# Altium footprint library Contact.PcbLib: 85 footprints (part 1 of 6)
Each footprint in its own frame and in the unit in brackets; x right, y up, seen from the top. Pads: shape width x height; smd on the part's side, far side on the other; paste and mask are expansions set on the pad; w line width, h text height; cw(c..) or ccw(c..) is an arc to the next point about the centre after c.
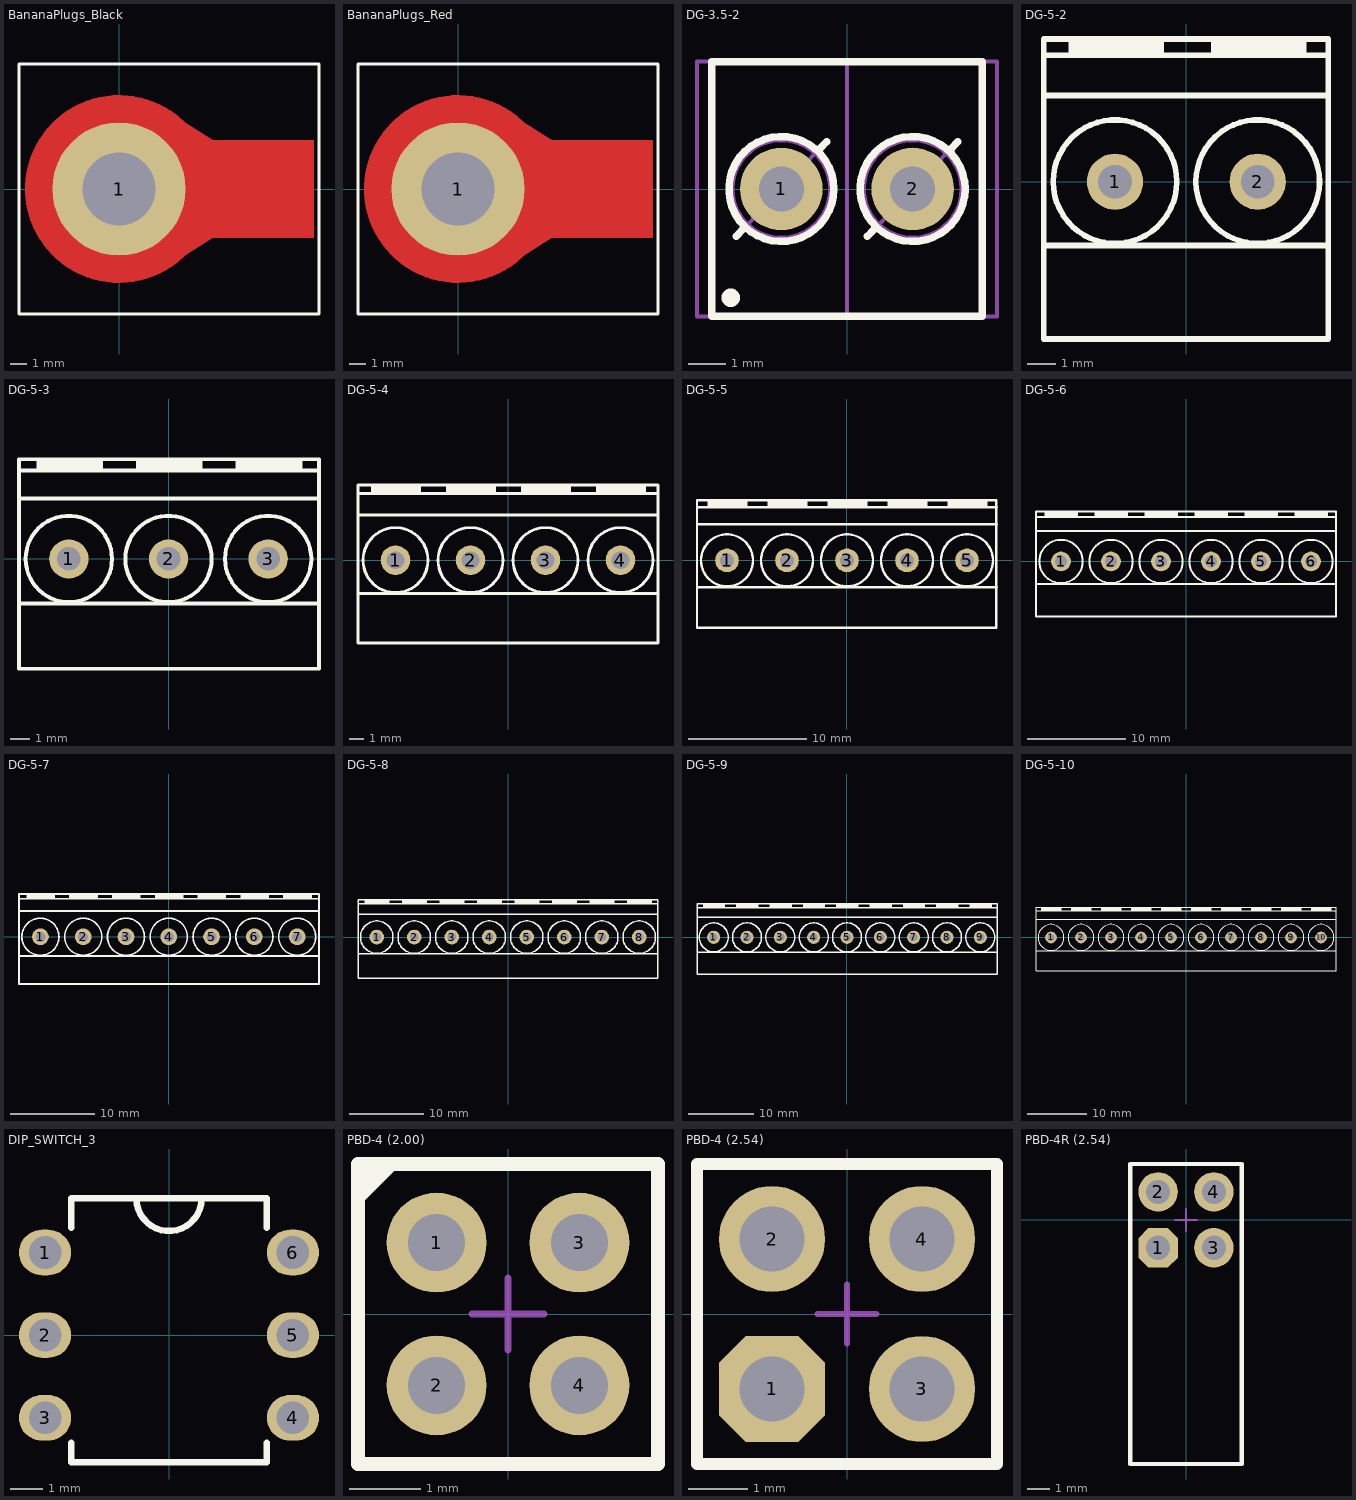
[diagram p0: the footprints below, top view; thin cyan lines are the x and y axes]

## BananaPlugs_Black [mm]
pads (1):
  round 8 hole 4.4: 1(0,0)
Top Layer:
  region: 2.936,-4.634 2.627,-4.831 1.961,-5.137 1.26,-5.352 0.537,-5.472 -0.196,-5.495 -0.926,-5.42 -1.639,-5.249 -2.322,-4.984 -2.965,-4.631 -3.554,-4.195 -4.081,-3.685 -4.535,-3.109 -4.908,-2.478 -5.195,-1.803 -5.388,-1.096 -5.486,-0.37 -5.487,0.363 -5.39,1.09 -5.197,1.797 -4.911,2.473 -4.539,3.104 -4.085,3.68 -3.559,4.191 -2.97,4.628 -2.328,4.982 -1.644,5.247 -0.932,5.419 -0.203,5.495 0.53,5.473 1.254,5.354 1.955,5.139 2.621,4.834 2.931,4.638 10.26,0.006
  region: 0,0 11.684,0 11.684,2.921 0,2.921
  region: 0,-2.921 11.684,-2.921 11.684,0 0,0
  lines w0.305: 4.03,-3.723 cw(c0,0) 4.03,3.723 ; 4.039,-3.708 7.747,0 4.039,3.708
Bottom Layer:
  region: 4.03,-3.723 3.781,-3.992 3.218,-4.458 2.598,-4.846 1.932,-5.148 1.232,-5.359 0.51,-5.475 -0.221,-5.494 -0.948,-5.416 -1.659,-5.242 -2.34,-4.976 -2.979,-4.622 -3.566,-4.185 -4.09,-3.675 -4.542,-3.1 -4.913,-2.47 -5.197,-1.796 -5.389,-1.09 -5.486,-0.366 -5.486,0.366 -5.389,1.09 -5.197,1.796 -4.913,2.47 -4.542,3.1 -4.09,3.675 -3.566,4.185 -2.979,4.622 -2.34,4.976 -1.659,5.242 -0.948,5.416 -0.221,5.494 0.51,5.475 1.232,5.359 1.932,5.148 2.598,4.846 3.218,4.458 3.781,3.992 4.03,3.723 4.039,3.708 7.747,0
  region: 2.936,-4.634 2.627,-4.831 1.961,-5.137 1.26,-5.352 0.537,-5.472 -0.196,-5.495 -0.926,-5.42 -1.639,-5.249 -2.322,-4.984 -2.965,-4.631 -3.554,-4.195 -4.081,-3.685 -4.535,-3.109 -4.908,-2.478 -5.195,-1.803 -5.388,-1.096 -5.486,-0.37 -5.487,0.363 -5.39,1.09 -5.197,1.797 -4.911,2.473 -4.539,3.104 -4.085,3.68 -3.559,4.191 -2.97,4.628 -2.328,4.982 -1.644,5.247 -0.932,5.419 -0.203,5.495 0.53,5.473 1.254,5.354 1.955,5.139 2.621,4.834 2.931,4.638 10.26,0.006
  region: 0,-2.921 11.684,-2.921 11.684,0 0,0
  region: 0,0 11.684,0 11.684,2.921 0,2.921
Top Overlay:
  lines w0.2: -6,-7.5 0,-7.5 3,-7.5 12,-7.5 12,7.5 -6,7.5 -6,-7.5
Top Solder:
  region: 4.03,-3.723 3.781,-3.992 3.218,-4.458 2.598,-4.846 1.932,-5.148 1.232,-5.359 0.51,-5.475 -0.221,-5.494 -0.948,-5.416 -1.659,-5.242 -2.34,-4.976 -2.979,-4.622 -3.566,-4.185 -4.09,-3.675 -4.542,-3.1 -4.913,-2.47 -5.197,-1.796 -5.389,-1.09 -5.486,-0.366 -5.486,0.366 -5.389,1.09 -5.197,1.796 -4.913,2.47 -4.542,3.1 -4.09,3.675 -3.566,4.185 -2.979,4.622 -2.34,4.976 -1.659,5.242 -0.948,5.416 -0.221,5.494 0.51,5.475 1.232,5.359 1.932,5.148 2.598,4.846 3.218,4.458 3.781,3.992 4.03,3.723 4.039,3.708 7.747,0
  region: 0,0 11.684,0 11.684,2.921 0,2.921
  region: 0,-2.921 11.684,-2.921 11.684,0 0,0
Bottom Solder:
  region: 4.03,-3.723 3.781,-3.992 3.218,-4.458 2.598,-4.846 1.932,-5.148 1.232,-5.359 0.51,-5.475 -0.221,-5.494 -0.948,-5.416 -1.659,-5.242 -2.34,-4.976 -2.979,-4.622 -3.566,-4.185 -4.09,-3.675 -4.542,-3.1 -4.913,-2.47 -5.197,-1.796 -5.389,-1.09 -5.486,-0.366 -5.486,0.366 -5.389,1.09 -5.197,1.796 -4.913,2.47 -4.542,3.1 -4.09,3.675 -3.566,4.185 -2.979,4.622 -2.34,4.976 -1.659,5.242 -0.948,5.416 -0.221,5.494 0.51,5.475 1.232,5.359 1.932,5.148 2.598,4.846 3.218,4.458 3.781,3.992 4.03,3.723 4.039,3.708 7.747,0
  region: 0,-2.921 11.684,-2.921 11.684,0 0,0
  region: 0,0 11.684,0 11.684,2.921 0,2.921
3D body "User Library-ST-351B V1 - BLACK.STEP": height 8.3, standoff -7.7, extent -5.65,-5.644 11.6,5.644

## BananaPlugs_Red [mm]
pads (1):
  round 8 hole 4.4: 1(0,0)
Top Layer:
  region: 0,-2.921 11.684,-2.921 11.684,0 0,0
  region: 0,0 11.684,0 11.684,2.921 0,2.921
  region: 2.936,-4.634 2.627,-4.831 1.961,-5.137 1.26,-5.352 0.537,-5.472 -0.196,-5.495 -0.926,-5.42 -1.639,-5.249 -2.322,-4.984 -2.965,-4.631 -3.554,-4.195 -4.081,-3.685 -4.535,-3.109 -4.908,-2.478 -5.195,-1.803 -5.388,-1.096 -5.486,-0.37 -5.487,0.363 -5.39,1.09 -5.197,1.797 -4.911,2.473 -4.539,3.104 -4.085,3.68 -3.559,4.191 -2.97,4.628 -2.328,4.982 -1.644,5.247 -0.932,5.419 -0.203,5.495 0.53,5.473 1.254,5.354 1.955,5.139 2.621,4.834 2.931,4.638 10.26,0.006
  lines w0.305: 4.03,-3.723 cw(c0,0) 4.03,3.723 ; 4.039,-3.708 7.747,0 4.039,3.708
Bottom Layer:
  region: 0,0 11.684,0 11.684,2.921 0,2.921
  region: 0,-2.921 11.684,-2.921 11.684,0 0,0
  region: 2.936,-4.634 2.627,-4.831 1.961,-5.137 1.26,-5.352 0.537,-5.472 -0.196,-5.495 -0.926,-5.42 -1.639,-5.249 -2.322,-4.984 -2.965,-4.631 -3.554,-4.195 -4.081,-3.685 -4.535,-3.109 -4.908,-2.478 -5.195,-1.803 -5.388,-1.096 -5.486,-0.37 -5.487,0.363 -5.39,1.09 -5.197,1.797 -4.911,2.473 -4.539,3.104 -4.085,3.68 -3.559,4.191 -2.97,4.628 -2.328,4.982 -1.644,5.247 -0.932,5.419 -0.203,5.495 0.53,5.473 1.254,5.354 1.955,5.139 2.621,4.834 2.931,4.638 10.26,0.006
  region: 4.03,-3.723 3.781,-3.992 3.218,-4.458 2.598,-4.846 1.932,-5.148 1.232,-5.359 0.51,-5.475 -0.221,-5.494 -0.948,-5.416 -1.659,-5.242 -2.34,-4.976 -2.979,-4.622 -3.566,-4.185 -4.09,-3.675 -4.542,-3.1 -4.913,-2.47 -5.197,-1.796 -5.389,-1.09 -5.486,-0.366 -5.486,0.366 -5.389,1.09 -5.197,1.796 -4.913,2.47 -4.542,3.1 -4.09,3.675 -3.566,4.185 -2.979,4.622 -2.34,4.976 -1.659,5.242 -0.948,5.416 -0.221,5.494 0.51,5.475 1.232,5.359 1.932,5.148 2.598,4.846 3.218,4.458 3.781,3.992 4.03,3.723 4.039,3.708 7.747,0
Top Overlay:
  lines w0.2: -6,-7.5 -6,7.5 12,7.5 12,-7.5 3,-7.5 0,-7.5 -6,-7.5
Top Solder:
  region: 0,-2.921 11.684,-2.921 11.684,0 0,0
  region: 0,0 11.684,0 11.684,2.921 0,2.921
  region: 4.03,-3.723 3.781,-3.992 3.218,-4.458 2.598,-4.846 1.932,-5.148 1.232,-5.359 0.51,-5.475 -0.221,-5.494 -0.948,-5.416 -1.659,-5.242 -2.34,-4.976 -2.979,-4.622 -3.566,-4.185 -4.09,-3.675 -4.542,-3.1 -4.913,-2.47 -5.197,-1.796 -5.389,-1.09 -5.486,-0.366 -5.486,0.366 -5.389,1.09 -5.197,1.796 -4.913,2.47 -4.542,3.1 -4.09,3.675 -3.566,4.185 -2.979,4.622 -2.34,4.976 -1.659,5.242 -0.948,5.416 -0.221,5.494 0.51,5.475 1.232,5.359 1.932,5.148 2.598,4.846 3.218,4.458 3.781,3.992 4.03,3.723 4.039,3.708 7.747,0
Bottom Solder:
  region: 0,0 11.684,0 11.684,2.921 0,2.921
  region: 0,-2.921 11.684,-2.921 11.684,0 0,0
  region: 4.03,-3.723 3.781,-3.992 3.218,-4.458 2.598,-4.846 1.932,-5.148 1.232,-5.359 0.51,-5.475 -0.221,-5.494 -0.948,-5.416 -1.659,-5.242 -2.34,-4.976 -2.979,-4.622 -3.566,-4.185 -4.09,-3.675 -4.542,-3.1 -4.913,-2.47 -5.197,-1.796 -5.389,-1.09 -5.486,-0.366 -5.486,0.366 -5.389,1.09 -5.197,1.796 -4.913,2.47 -4.542,3.1 -4.09,3.675 -3.566,4.185 -2.979,4.622 -2.34,4.976 -1.659,5.242 -0.948,5.416 -0.221,5.494 0.51,5.475 1.232,5.359 1.932,5.148 2.598,4.846 3.218,4.458 3.781,3.992 4.03,3.723 4.039,3.708 7.747,0
3D body "User Library-ST-351A V1 - RED.STEP": height 8.3, standoff -7.7, extent -5.65,-5.644 11.6,5.643

## DG-3.5-2 [mm]
pads (3):
  round 2.2 hole 1.2: 1(-1.75,0) 2(1.75,0)
  round 0.5 on Top Overlay: ""(-3.1,-2.9)
Top Overlay:
  circle w0.2: c1.75,0 r1.4
  circle w0.2: c-1.75,0 r1.4
  lines w0.2: -2.959,-1.266 -2.776,-1.074 ; -0.724,1.074 -0.541,1.267 ; 0.541,-1.266 0.724,-1.074 ; 2.776,1.074 2.959,1.267 ; -3.6,-3.4 3.6,-3.4 3.6,3.4 -3.6,3.4 -3.6,-3.4
Mechanical 1:
  circle w0.1: c-1.75,0 r1.3
  circle w0.1: c1.75,0 r1.3
  lines w0.1: -2.632,-0.931 -0.868,0.931 ; 0,-3.4 0,3.4 ; 0.868,-0.931 2.632,0.931 ; -4,-3.4 -4,3.4 4,3.4 4,-3.4 -4,-3.4
Mechanical 15:
  lines w0.1: -4,-3.4 -4,3.4 4,3.4 4,-3.4 -4,-3.4
3D body "User Library-DG350-3,5-02P.STEP": height 8.4, standoff -3.4, extent -4,-3.4 4,3.4

## DG-5-2 [mm] "Terminal Block Green"
pads (2):
  round 2 / inner round 2 / far side oval 2.4x3 hole 1.2: 1(-2.54,0) 2(2.54,0)
Top Overlay:
  circle w0.2: c-2.54,0 r2.2
  circle w0.2: c2.54,0 r2.2
  rectangle: -4.2,4.5 -0.8,5.08
  rectangle: 0.88,4.5 4.28,5.08
  lines w0.2: -5.08,-2.27 5.055,-2.27 ; -5.08,3.07 5.055,3.07 ; -5.08,4.5 5.055,4.5 ; -5.08,-5.6 5.055,-5.6 5.055,5.08 -5.08,5.08 -5.08,-5.6
3D body "User Library-klema-5mm-2pin.step": height 14, standoff -4, extent -5,-5.5 5,5

## DG-5-3 [mm] "Terminal Block Green"
pads (3):
  round 2 / inner round 2 / far side oval 2.4x3 hole 1.2: 1(-5.08,0) 2(0,0) 3(5.08,0)
Top Overlay:
  circle w0.2: c5.08,0 r2.2
  circle w0.2: c0,0 r2.2
  circle w0.2: c-5.08,0 r2.2
  rectangle: -6.74,4.5 -3.34,5.08
  rectangle: -1.66,4.5 1.74,5.08
  rectangle: 3.42,4.5 6.82,5.08
  lines w0.2: -7.62,-2.27 7.6,-2.27 ; -7.62,3.07 7.6,3.07 ; -7.62,4.5 7.6,4.5 ; -7.62,-5.6 7.671,-5.6 7.671,5.08 -7.62,5.08 -7.62,-5.6
3D body "User Library-klema-5mm-3pin.step": height 14.1, standoff -3.9, extent -7.5,-5.5 7.5,5

## DG-5-4 [mm] "Terminal Block Green"
pads (4):
  round 2 / inner round 2 / far side oval 2.4x3 hole 1.2: 1(-7.62,0) 2(-2.54,0) 3(2.54,0) 4(7.62,0)
Top Overlay:
  circle w0.2: c7.62,0 r2.2
  circle w0.2: c2.54,0 r2.2
  circle w0.2: c-2.54,0 r2.2
  circle w0.2: c-7.62,0 r2.2
  rectangle: 5.96,4.5 9.36,5.08
  rectangle: 0.88,4.5 4.28,5.08
  rectangle: -4.2,4.5 -0.8,5.08
  rectangle: -9.28,4.5 -5.88,5.08
  lines w0.2: -10.16,-2.27 10.16,-2.27 ; -10.16,3.07 10.16,3.07 ; -10.16,4.5 10.16,4.5 ; -10.16,-5.6 10.16,-5.6 10.16,5.08 -10.16,5.08 -10.16,-5.6
3D body "User Library-klema-5mm-2pin.step": height 14, standoff -4, extent 0.08,-5.5 10.08,5
3D body "User Library-klema-5mm-2pin.step": height 14, standoff -4, extent -10.08,-5.5 -0.08,5

## DG-5-5 [mm] "Terminal Block Green"
pads (5):
  round 2 / inner round 2 / far side oval 2.4x3 hole 1.2: 1(-10.16,0) 2(-5.08,0) 3(0,0) 4(5.08,0) 5(10.16,0)
Top Overlay:
  circle w0.2: c10.16,0 r2.2
  circle w0.2: c5.08,0 r2.2
  circle w0.2: c0,0 r2.2
  circle w0.2: c-5.08,0 r2.2
  circle w0.2: c-10.16,0 r2.2
  rectangle: 8.5,4.5 11.9,5.08
  rectangle: 3.42,4.5 6.82,5.08
  rectangle: -1.66,4.5 1.74,5.08
  rectangle: -6.74,4.5 -3.34,5.08
  rectangle: -11.82,4.5 -8.42,5.08
  lines w0.2: -12.7,-2.27 12.7,-2.27 ; -12.7,3.07 12.7,3.07 ; -12.7,4.5 12.7,4.5 ; -12.7,-5.7 12.649,-5.7 12.649,5.08 -12.7,5.08 -12.7,-5.7
3D body "User Library-klema-5mm-2pin.step": height 14, standoff -4, extent 2.62,-5.5 12.62,5
3D body "User Library-klema-5mm-3pin.step": height 14.1, standoff -3.9, extent -12.58,-5.5 2.42,5

## DG-5-6 [mm] "Terminal Block Green"
pads (6):
  round 2 / inner round 2 / far side oval 2.4x3 hole 1.2: 1(-12.7,0) 2(-7.62,0) 3(-2.54,0) 4(2.54,0) 5(7.62,0) 6(12.7,0)
Top Overlay:
  circle w0.2: c12.7,0 r2.2
  circle w0.2: c7.62,0 r2.2
  circle w0.2: c2.54,0 r2.2
  circle w0.2: c-2.54,0 r2.2
  circle w0.2: c-7.62,0 r2.2
  circle w0.2: c-12.7,0 r2.2
  rectangle: 11.04,4.5 14.44,5.08
  rectangle: 5.96,4.5 9.36,5.08
  rectangle: 0.88,4.5 4.28,5.08
  rectangle: -4.2,4.5 -0.8,5.08
  rectangle: -9.28,4.5 -5.88,5.08
  rectangle: -14.36,4.5 -10.96,5.08
  lines w0.2: -15.24,-2.27 15.2,-2.27 ; -15.24,3.07 15.2,3.07 ; -15.24,4.5 15.2,4.5 ; -15.24,-5.6 -15.24,5.08 15.24,5.08 15.24,-5.6 -15.24,-5.6
3D body "User Library-klema-5mm-3pin.step": height 14.1, standoff -3.9, extent -15.12,-5.5 -0.12,5
3D body "User Library-klema-5mm-3pin.step": height 14.1, standoff -3.9, extent 0.12,-5.5 15.12,5

## DG-5-7 [mm] "Terminal Block Green"
pads (7):
  round 2 / inner round 2 / far side oval 2.4x3 hole 1.2: 1(-15.24,0) 2(-10.16,0) 3(-5.08,0) 4(0,0) 5(5.08,0) 6(10.16,0) 7(15.24,0)
Top Overlay:
  circle w0.2: c15.24,0 r2.2
  circle w0.2: c10.16,0 r2.2
  circle w0.2: c5.08,0 r2.2
  circle w0.2: c0,0 r2.2
  circle w0.2: c-5.08,0 r2.2
  circle w0.2: c-10.16,0 r2.2
  circle w0.2: c-15.24,0 r2.2
  rectangle: 13.58,4.5 16.98,5.08
  rectangle: 8.5,4.5 11.9,5.08
  rectangle: 3.42,4.5 6.82,5.08
  rectangle: -1.66,4.5 1.74,5.08
  rectangle: -6.74,4.5 -3.34,5.08
  rectangle: -11.82,4.5 -8.42,5.08
  rectangle: -16.9,4.5 -13.5,5.08
  lines w0.2: -17.78,-2.27 17.8,-2.27 ; -17.78,3.07 17.8,3.07 ; -17.78,4.5 17.8,4.5 ; -17.78,-5.6 17.831,-5.6 17.831,5.08 -17.78,5.08 -17.78,-5.6
3D body "User Library-klema-5mm-3pin.step": height 14.1, standoff -3.9, extent 2.66,-5.5 17.66,5
3D body "User Library-klema-5mm-2pin.step": height 14, standoff -4, extent -17.7,-5.5 -7.7,5
3D body "User Library-klema-5mm-2pin.step": height 14, standoff -4, extent -7.54,-5.5 2.46,5

## DG-5-8 [mm] "Terminal Block Green"
pads (8):
  round 2 / inner round 2 / far side oval 2.4x3 hole 1.2: 1(-17.78,0) 2(-12.7,0) 3(-7.62,0) 4(-2.54,0) 5(2.54,0) 6(7.62,0) 7(12.7,0) 8(17.78,0)
Top Overlay:
  circle w0.2: c17.78,0 r2.2
  circle w0.2: c12.7,0 r2.2
  circle w0.2: c7.62,0 r2.2
  circle w0.2: c2.54,0 r2.2
  circle w0.2: c-2.54,0 r2.2
  circle w0.2: c-7.62,0 r2.2
  circle w0.2: c-12.7,0 r2.2
  circle w0.2: c-17.78,0 r2.2
  rectangle: 16.12,4.5 19.52,5.08
  rectangle: 11.04,4.5 14.44,5.08
  rectangle: 5.96,4.5 9.36,5.08
  rectangle: 0.88,4.5 4.28,5.08
  rectangle: -4.2,4.5 -0.8,5.08
  rectangle: -9.28,4.5 -5.88,5.08
  rectangle: -14.36,4.5 -10.96,5.08
  rectangle: -19.44,4.5 -16.04,5.08
  lines w0.2: -20.32,-2.27 20.32,-2.27 ; -20.32,3.07 20.32,3.07 ; -20.32,4.5 20.32,4.5 ; -20.32,-5.6 -20.32,5.08 20.32,5.08 20.32,-5.6 -20.32,-5.6
3D body "User Library-klema-5mm-2pin.step": height 14, standoff -4, extent -20.24,-5.5 -10.24,5
3D body "User Library-klema-5mm-3pin.step": height 14.1, standoff -3.9, extent -10.04,-5.5 4.96,5
3D body "User Library-klema-5mm-3pin.step": height 14.1, standoff -3.9, extent 5.2,-5.5 20.2,5

## DG-5-9 [mm] "Terminal Block Green"
pads (9):
  round 2 / inner round 2 / far side oval 2.4x3 hole 1.2: 1(-20.32,0) 2(-15.24,0) 3(-10.16,0) 4(-5.08,0) 5(0,0) 6(5.08,0) 7(10.16,0) 8(15.24,0) 9(20.32,0)
Top Overlay:
  circle w0.2: c-20.32,0 r2.2
  circle w0.2: c-15.24,0 r2.2
  circle w0.2: c-10.16,0 r2.2
  circle w0.2: c-5.08,0 r2.2
  circle w0.2: c0,0 r2.2
  circle w0.2: c5.08,0 r2.2
  circle w0.2: c10.16,0 r2.2
  circle w0.2: c15.24,0 r2.2
  circle w0.2: c20.32,0 r2.2
  rectangle: -21.98,4.5 -18.58,5.08
  rectangle: -16.9,4.5 -13.5,5.08
  rectangle: -11.82,4.5 -8.42,5.08
  rectangle: -6.74,4.5 -3.34,5.08
  rectangle: -1.66,4.5 1.74,5.08
  rectangle: 3.42,4.5 6.82,5.08
  rectangle: 8.5,4.5 11.9,5.08
  rectangle: 13.58,4.5 16.98,5.08
  rectangle: 18.66,4.5 22.06,5.08
  lines w0.2: -22.86,-2.27 22.86,-2.27 ; -22.86,3.07 22.86,3.07 ; -22.86,4.5 22.86,4.5 ; -22.86,-5.6 22.86,-5.6 22.86,5.08 -22.86,5.08 -22.86,-5.6
3D body "User Library-klema-5mm-3pin.step": height 14.1, standoff -3.9, extent 7.74,-5.5 22.74,5
3D body "User Library-klema-5mm-3pin.step": height 14.1, standoff -3.9, extent -7.5,-5.5 7.5,5
3D body "User Library-klema-5mm-3pin.step": height 14.1, standoff -3.9, extent -22.74,-5.5 -7.74,5

## DG-5-10 [mm] "Terminal Block Green"
pads (10):
  round 2 / inner round 2 / far side oval 2.4x3 hole 1.2: 1(-22.86,0) 2(-17.78,0) 3(-12.7,0) 4(-7.62,0) 5(-2.54,0) 6(2.54,0) 7(7.62,0) 8(12.7,0) 9(17.78,0) 10(22.86,0)
Top Overlay:
  circle w0.2: c-22.86,0 r2.2
  circle w0.2: c-17.78,0 r2.2
  circle w0.2: c-12.7,0 r2.2
  circle w0.2: c-7.62,0 r2.2
  circle w0.2: c-2.54,0 r2.2
  circle w0.2: c2.54,0 r2.2
  circle w0.2: c7.62,0 r2.2
  circle w0.2: c12.7,0 r2.2
  circle w0.2: c17.78,0 r2.2
  circle w0.2: c22.86,0 r2.2
  rectangle: -24.52,4.5 -21.12,5.08
  rectangle: -19.44,4.5 -16.04,5.08
  rectangle: -14.36,4.5 -10.96,5.08
  rectangle: -9.28,4.5 -5.88,5.08
  rectangle: -4.2,4.5 -0.8,5.08
  rectangle: 0.88,4.5 4.28,5.08
  rectangle: 5.96,4.5 9.36,5.08
  rectangle: 11.04,4.5 14.44,5.08
  rectangle: 16.12,4.5 19.52,5.08
  rectangle: 21.2,4.5 24.6,5.08
  lines w0.2: -25.4,-2.27 25.4,-2.27 ; -25.4,3.07 25.4,3.07 ; -25.4,4.5 25.4,4.5 ; -25.4,-5.6 -25.4,5.08 25.4,5.08 25.4,-5.6 -25.4,-5.6
3D body "User Library-klema-5mm-3pin.step": height 14.1, standoff -3.9, extent 10.28,-5.5 25.28,5
3D body "User Library-klema-5mm-3pin.step": height 14.1, standoff -3.9, extent -25.28,-5.5 -10.28,5
3D body "User Library-klema-5mm-2pin.step": height 14, standoff -4, extent -10.08,-5.5 -0.08,5
3D body "User Library-klema-5mm-2pin.step": height 14, standoff -4, extent 0.08,-5.5 10.08,5

## DIP_SWITCH_3 [mm] "DIP, pitch 2.54mm, 300mil Width"
pads (6):
  oval 1.6x1.4 hole 1: 1(-3.81,2.54) 2(-3.81,0) 3(-3.81,-2.54) 4(3.81,-2.54) 5(3.81,0) 6(3.81,2.54)
Top Overlay:
  lines w0.2: -3,-3.3 -3,-3.9 3,-3.9 3,-3.3 ; -3,3.3 -3,4.2 3,4.2 3,3.3 ; -1,4.2 ccw(c0,4.2) 1,4.2
3D body "User Library-switch 3.step": height 7.01, standoff -3.69, extent -4.95,-3.824 4.95,4.31

## PBD-4 (2.00) [mm] "PBD-4"
height 10
pads (4):
  round 1.4 hole 0.8: 1(-1,1) 2(-1,-1) 3(1,1) 4(1,-1)
Top Overlay:
  region: -2.1,1.5
  region: -2.1,1.5 -1.5,2.1 -2.1,2.1
  lines w0.2: -2.1,-2.1 -2.1,2.1 2.1,2.1 2.1,-2.1 -2.1,-2.1
Mechanical 1:
  lines w0.1: -2.1,-2.1 -2.1,2.1 2.1,2.1 2.1,-2.1 -2.1,-2.1
Mechanical 15:
  lines w0.1: -0.5,0 0.5,0 ; 0,-0.5 0,0.5 ; -2.1,-2.1 -2.1,2.1 2.1,2.1 2.1,-2.1 -2.1,-2.1
3D body "791077001-1.STEP": height 4.22, standoff -3.22, extent -2.095,-2.095 2.095,2.095

## PBD-4 (2.54) [mm] "PBD-4"
height 10
pads (4):
  oct 1.8x1.8 hole 1.1: 1(-1.27,-1.27)
  round 1.8 hole 1.1: 2(-1.27,1.27) 3(1.27,-1.27) 4(1.27,1.27)
Top Overlay:
  lines w0.2: -2.54,-2.54 2.54,-2.54 2.54,2.54 -2.54,2.54 -2.54,-2.54
Mechanical 1:
  lines w0.1: -2.54,-2.54 2.54,-2.54 2.54,2.54 -2.54,2.54 -2.54,-2.54
Mechanical 15:
  lines w0.1: -0.5,0 0.5,0 ; 0,-0.5 0,0.5 ; -2.54,-2.54 2.54,-2.54 2.54,2.54 -2.54,2.54 -2.54,-2.54
3D body "User Library-PBD-4R.STEP": height 8.53, standoff -0.57, extent -2.54,-2.54 2.54,2.54

## PBD-4R (2.54) [mm] "PBD-4"
height 10
pads (4):
  oct 1.8x1.8 hole 1.1: 1(-1.27,-1.27)
  round 1.8 hole 1.1: 2(-1.27,1.27) 3(1.27,-1.27) 4(1.27,1.27)
Top Overlay:
  lines w0.2: -2.54,-11.1 -2.54,2.54 2.54,2.54 2.54,-11.1 -2.54,-11.1
Mechanical 1:
  lines w0.1: -2.54,-11.1 -2.54,2.54 2.54,2.54 2.54,-11.1 -2.54,-11.1
Mechanical 15:
  lines w0.1: -0.5,0 0.5,0 ; 0,-0.5 0,0.5 ; -2.54,-11.1 -2.54,2.54 2.54,2.54 2.54,-11.1 -2.54,-11.1
3D body "User Library-PBD-4R.STEP": height 5.08, standoff -3.5, extent -2.54,-11.102 2.54,1.502